# Altium footprint library EPCOS.PcbLib: 178 footprints (part 2 of 12)
Each footprint in its own frame and in the unit in brackets; x right, y up, seen from the top. Pads: shape width x height; smd on the part's side, far side on the other; paste and mask are expansions set on the pad; w line width, h text height; cw(c..) or ccw(c..) is an arc to the next point about the centre after c.
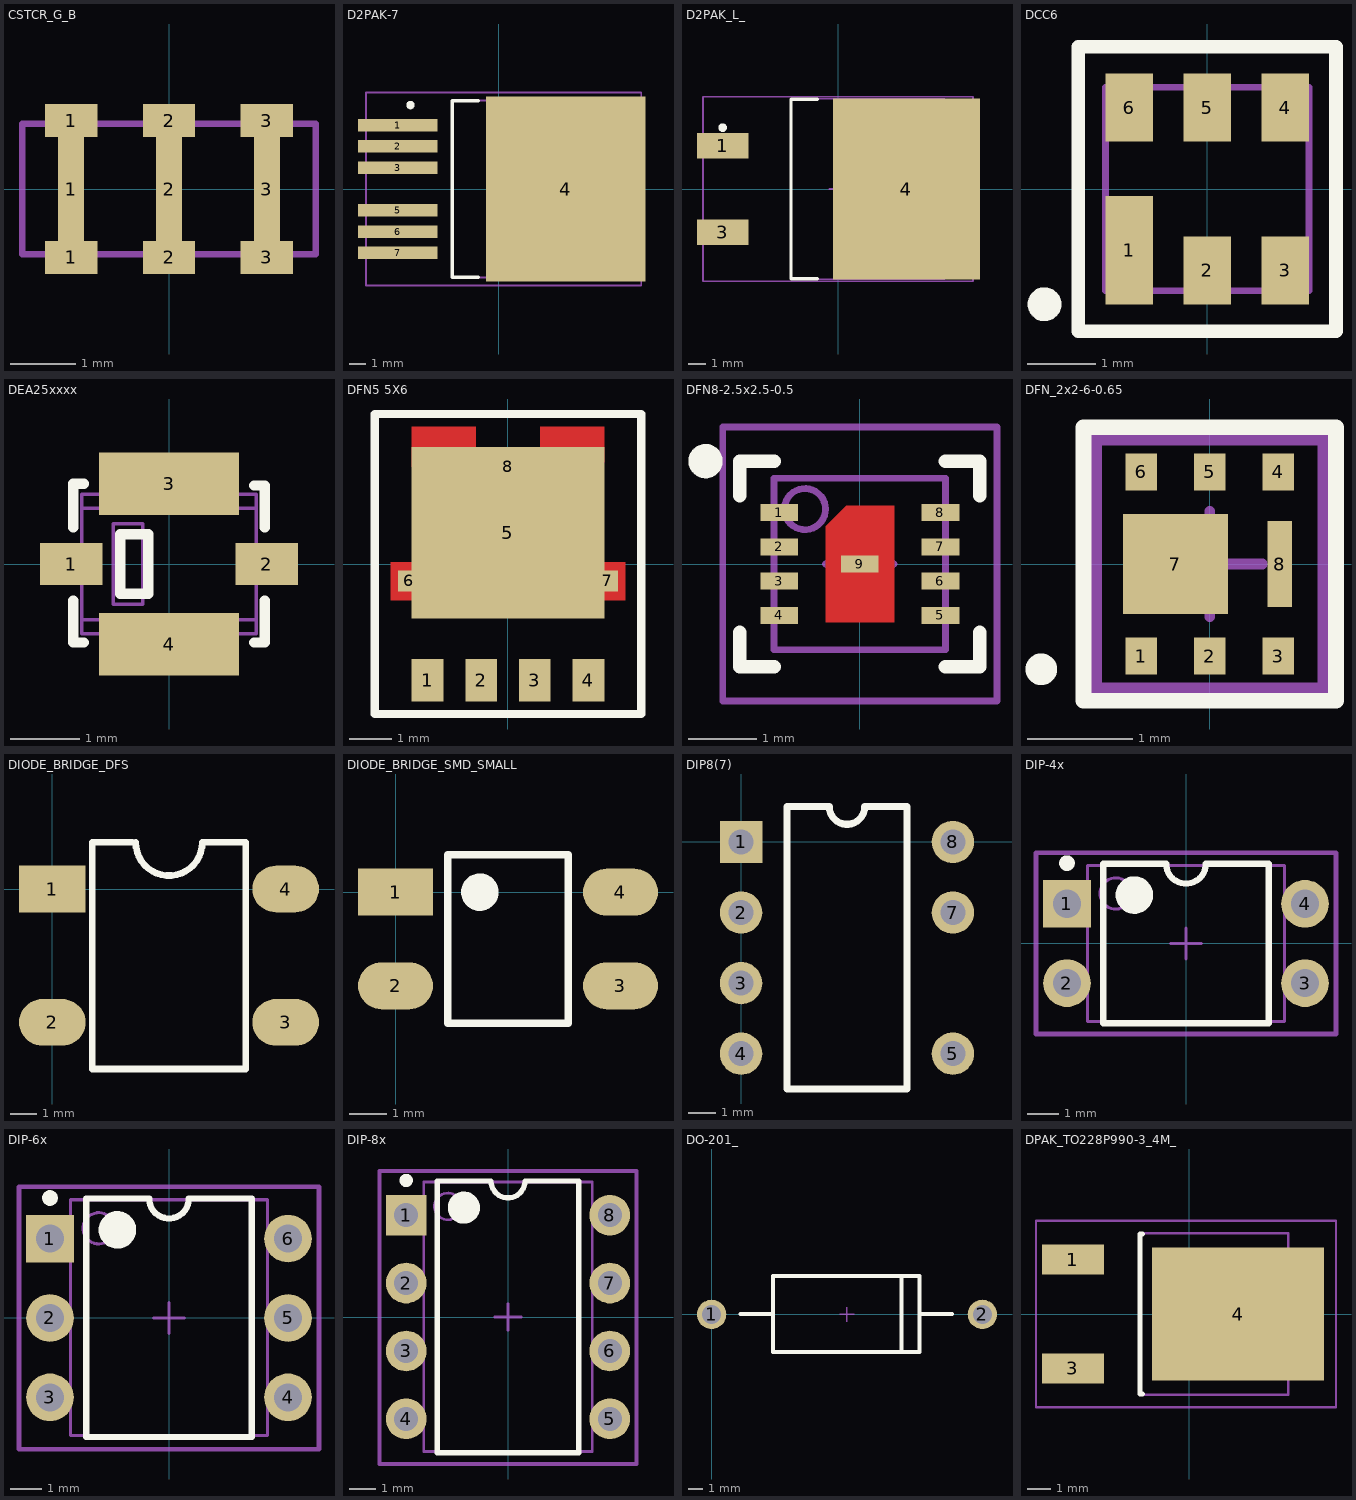
[diagram p1: the footprints below, top view; thin cyan lines are the x and y axes]

## CSTCR_G_B [mm]
height 1.15
pads (9):
  rect 0.8x0.5 smd: 1(-1.5,-1.05) 1(-1.5,1.05) 2(0,-1.05) 2(0,1.05) 3(1.5,-1.05) 3(1.5,1.05)
  rect 0.4x1.6 smd: 1(-1.5,0) 2(0,0) 3(1.5,0)
Mechanical 13:
  lines w0.1: -2.25,-1 -2.25,1 2.25,1 2.25,-1 -2.25,-1
3D body "User Library-CSTCR4M00G53.step": height 1.15, standoff 0, extent -2.25,-1 2.25,1

## D2PAK-7 [mm] "PG-TO263-7"
height 4.75
pads (7):
  rect 4.75x0.75 smd: 1(-6,3.81) 2(-6,2.54) 3(-6,1.27) 5(-6,-1.27) 6(-6,-2.54) 7(-6,-3.81)
  rect 9.5x11 smd: 4(4,0)
Top Overlay:
  circle w0.25: c-5.25,5 r0.125
  lines w0.2: -1.2,-5.25 -2.75,-5.25 -2.75,5.25 -1.2,5.25
Mechanical 13:
  lines w0.1: -2.75,-5.275 -2.75,5.275 6.25,5.275 6.25,-5.275 -2.75,-5.275
Mechanical 15:
  lines w0.1: -0.5,0 0.5,0 ; 0,-0.5 0,0.5 ; -7.9,-5.75 -7.9,5.75 8.5,5.75 8.5,-5.75 -7.9,-5.75
3D body "User Library-TO263-7S.STEP": height 4.88, standoff 0.08, extent -7.6,-5 8.07,5

## D2PAK_L_ [mm]
height 4.75
pads (3):
  rect 3x1.5 smd: 1(-6.75,2.54) 3(-6.75,-2.54)
  rect 8.6x10.6 smd: 4(4,0)
Top Overlay:
  circle w0.25: c-6.75,3.59 r0.125
  lines w0.2: -1.2,-5.25 -2.75,-5.25 -2.75,5.25 -1.2,5.25
Mechanical 13:
  lines w0.1: -2.75,-5.275 6.25,-5.275 6.25,5.275 -2.75,5.275 -2.75,-5.275
Mechanical 15:
  lines w0.1: -0.5,0 0.5,0 ; 0,-0.5 0,0.5 ; -7.9,-5.4 7.9,-5.4 7.9,5.4 -7.9,5.4 -7.9,-5.4
3D body "User Library-DPAK.step": height 4.98, standoff -0.03, extent -7.666,-5.08 7.598,5.08

## DCC6 [mm] "SAW Filter DCC6 Footprint"
height 1
pads (6):
  rect 0.7x1.6 smd paste+0 mask+0: 1(-1.15,-0.9)
  rect 0.7x1 smd paste+0 mask+0: 2(0,-1.2) 3(1.15,-1.2) 4(1.15,1.2) 5(0,1.2) 6(-1.15,1.2)
Top Overlay:
  circle w0.25: c-2.4,-1.7 r0.125
  lines w0.2: -1.9,-2.1 -1.9,-0.8 -1.9,2.1 1.2,2.1 1.9,2.1 1.9,-0.8 1.9,-2.1 1.2,-2.1 -1.9,-2.1
Mechanical 15:
  lines w0.1: -1.5,-1.5 1.5,-1.5 1.5,1.5 -1.5,1.5 -1.5,1 -1.5,-1.5
3D body "User Library-DCC6C.STEP": height 1.14, standoff -0.09, extent -1.5,-1.5 1.5,1.5

## DEA25xxxx [mm] "Multilayer Band Pass Filter"
height 1.5
pads (4):
  rect 0.9x0.6 smd: 1(-1.4,0) 2(1.4,0)
  rect 2x0.9 smd: 3(0,1.15) 4(0,-1.15)
Top Overlay:
  lines w0.15: -1.375,-0.525 -1.375,-1.125 -1.225,-1.125 ; -1.375,0.525 -1.375,1.15 -1.225,1.15 ; 1.225,-1.125 1.375,-1.125 1.375,-0.525 ; 1.225,1.125 1.375,1.125 1.375,0.525 ; -0.7,-0.425 -0.7,0.425 -0.3,0.425 -0.3,-0.425 -0.7,-0.425
Mechanical 13:
  lines w0.05: -1.25,-0.8 1.25,-0.8 ; -1.25,0.8 1.25,0.8 ; -1.25,-1 -1.25,1 1.25,1 1.25,-1 -1.25,-1 ; -1.25,-0.25 -1.25,0.25 -1,0.25 -1,-0.25 -1.25,-0.25 ; -0.8,-0.575 -0.8,0.575 -0.375,0.575 -0.375,-0.575 -0.8,-0.575 ; 1,-0.25 1.25,-0.25 1.25,0.225 1,0.225 1,-0.25
3D body: height 1.5, standoff 0, extent -0.799,-0.574 -0.376,0.574
3D body: height 1.49, standoff 0, extent -1.275,-1 1.275,1
3D body: height 1.5, standoff 0, extent -1.3,-1.025 1.3,-0.801
3D body: height 1.5, standoff 0, extent -1.3,-0.249 -1.001,0.249
3D body: height 1.5, standoff 0, extent -1.3,0.801 1.3,1.025
3D body: height 1.5, standoff 0, extent 1.001,-0.249 1.3,0.224

## DFN5 5X6 [mm]
height 1.1
pads (8):
  rect 0.75x1 smd: 1(-1.905,-2.75) 2(-0.635,-2.75) 3(0.635,-2.75) 4(1.905,-2.75)
  rect 4.56x4.055 smd: 5(0,0.743)
  rect 0.5x0.5 smd: 6(-2.35,-0.4) 7(2.35,-0.4) 8(0,2.3)
Top Layer:
  rectangle: -2.28,2.296 -0.76,3.25
  region: 2.28,3.25 0.76,3.25 0.76,2.396 2.28,2.396
  rectangle: -2.78,-0.86 -2,0.05
  region: 2.78,0.05 1.7,0.05 1.7,-0.86 2.78,-0.86
Top Overlay:
  lines w0.2: -3.15,-3.55 3.15,-3.55 3.15,3.55 -3.15,3.55 -3.15,-0.55 -3.15,-3.55
Top Solder:
  rectangle: -2.88,-0.96 -2.28,0.15
  region: 2.88,0.15 2.28,0.15 2.28,-0.96 2.88,-0.96
  rectangle: -2.38,2.85 -0.66,3.35
  region: 2.38,3.35 0.66,3.35 0.66,2.85 2.38,2.85
3D body "User Library-DFN8-5X6 DUAL.step": height 1.1, standoff 0, extent -2.575,-3.075 2.575,3.075

## DFN8-2.5x2.5-0.5 [mm]
height 0.9
pads (9):
  rect 0.55x0.25 smd: 1(-1.175,0.75) 2(-1.175,0.25) 3(-1.175,-0.25) 4(-1.175,-0.75) 5(1.175,-0.75) 6(1.175,-0.25) 7(1.175,0.25) 8(1.175,0.75) 9(0,0)
Top Layer:
  region: 0.5,0.85 0.5,-0.85 -0.5,-0.85 -0.5,0.55 -0.2,0.85
Top Overlay:
  circle w0.25: c-2.25,1.5 r0.125
  lines w0.2: -1.75,-1 -1.75,-1.5 -1.25,-1.5 ; -1.75,1 -1.75,1.5 -1.25,1.5 ; 1.25,-1.5 1.75,-1.5 1.75,-1 ; 1.25,1.5 1.75,1.5 1.75,1
Mechanical 13:
  circle w0.1: c-0.8,0.8 r0.3
  lines w0.1: -1.25,-1.25 -1.25,1.25 1.25,1.25 1.25,-1.25 -1.25,-1.25
Mechanical 15:
  lines w0.1: -0.5,0 0.5,0 ; 0,-0.5 0,0.5 ; -2,-2 -2,2 2,2 2,-2 -2,-2
3D body "User Library-sht3x-1.step": height 0.9, standoff 0, extent -1.25,-1.225 1.25,1.275

## DFN_2x2-6-0.65 [mm]
height 0.6
pads (8):
  rect 0.3x0.35 smd mask+0.05: 1(-0.65,-0.875) 2(0,-0.875) 3(0.65,-0.875) 4(0.65,0.875) 5(0,0.875) 6(-0.65,0.875)
  rect 1x0.95 smd mask+0.05: 7(-0.325,0)
  rect 0.23x0.82 smd mask+0.05: 8(0.665,0)
Top Overlay:
  circle w0.2: c-1.6,-1 r0.05
  lines w0.15: -1.2,-1.3 1.2,-1.3 1.2,1.3 -1.2,1.3 -1.2,-1.3
Mechanical 15:
  lines w0.1: -0.5,0 0.5,0 ; 0,-0.5 0,0.5
  lines w0.15: -1.1,-1.2 1.1,-1.2 1.1,1.2 -1.1,1.2 -1.1,-1.2
3D body "User Library-dfnw6.step": height 0.85, standoff 0, extent -1,-1.1 1,1.1

## DIODE_BRIDGE_DFS [mil]
height 157.48
pads (4):
  rect 100x70 smd: 1(0,0)
  oval 100x70 smd: 2(0,-200) 3(350,-200) 4(350,0)
Top Overlay:
  lines w10: 120,70 60,70 60,-270 290,-270 290,70 225,70 cw(c175,70) 125,70
3D body: height 0, standoff 0, extent 59.98,-270.02 290.02,70.02
3D body "User Library-Bridge rectifier DFS package-1.step": height 118.75, standoff 0, extent -21.14,-271.65 371.37,74.81

## DIODE_BRIDGE_SMD_SMALL [mm]
height 2.9
pads (4):
  rect 2x1.25 smd: 1(0,0)
  oval 2x1.25 smd: 2(0,-2.5) 3(6,-2.5) 4(6,0)
Top Overlay:
  circle w0.5: c2.25,0 r0.25
  lines w0.2: 1.4,-3.5 1.4,1 4.6,1 4.6,-3.5 1.4,-3.5
3D body "User Library-SO4.step": height 2.18, standoff 0, extent -0.04,-3.3 6.04,0.8

## DIP8(7) [mil]
pads (7):
  rect 60x60 hole 35.43: 1(0,0)
  round 60 hole 35.43: 2(0,-100) 3(0,-200) 4(0,-300) 5(300,-300) 7(300,-100) 8(300,0)
Top Overlay:
  lines w10: 65,-350 65,50 125,50 ccw(c150,50) 175,50 235,50 235,-350 65,-350

## DIP-4x [mil] "DIP, 4-Pin, Row Spacing 7.62 mm, Pitch 2.54 mm"
height 179.92
pads (4):
  rect 60x60 hole 35.43: 1(-150,50)
  round 60 hole 35.43: 2(-150,-50) 3(150,-50) 4(150,50)
Top Overlay:
  circle w23.62: c-64.96,61.02 r11.81
  circle w9.84: c-150,101.18 r4.92
  lines w7.87: -104.33,-100.39 104.33,-100.39 104.33,100.39 25,100.39 cw(c0,100.39) -25,100.39 -104.33,100.39 -104.33,-100.39
Mechanical 13:
  circle w3.94: c-88.58,62.99 r19.68
  lines w3.94: -124.02,-98.43 124.02,-98.43 124.02,98.43 -124.02,98.43 -124.02,-98.43
Mechanical 15:
  lines w3.94: -19.68,0 19.68,0 ; 0,-19.68 0,19.68
  lines w5.91: -188.98,-114.17 188.98,-114.17 188.98,114.17 -188.98,114.17 -188.98,-114.17
3D body "User Library-DIP4-7_62-2_54.step": height 169.29, standoff -106.3, extent -155.11,-90.35 155.12,90.37

## DIP-6x [mil] "DIP, 6-Pin, Row Spacing 7.62 mm, Pitch 2.54 mm"
height 179.92
pads (6):
  rect 60x60 hole 35.43: 1(-150,100)
  round 60 hole 35.43: 2(-150,0) 3(-150,-100) 4(150,-100) 5(150,0) 6(150,100)
Top Overlay:
  circle w9.84: c-150,151.18 r4.92
  circle w23.62: c-64.96,111.02 r11.81
  lines w7.87: -104.33,-150 -104.33,150.39 -25,150.39 ccw(c0,150.39) 25,150.39 104.33,150.39 104.33,-150 -104.33,-150
Mechanical 13:
  circle w3.94: c-88.58,112.99 r19.68
  lines w3.94: -124.02,-148 -124.02,149 124.02,149 124.02,-148 -124.02,-148
Mechanical 15:
  lines w3.94: -19.68,0 19.68,0 ; 0,-19.68 0,19.68
  lines w5.91: -188.98,-165.35 188.98,-165.35 188.98,165.35 -188.98,165.35 -188.98,-165.35
3D body "User Library-DIP6-White.STEP": height 177.17, standoff -110.24, extent -154.92,-138.58 154.92,141.73

## DIP-8x [mil] "DIP, 8-Pin, Row Spacing 7.62 mm, Pitch 2.54 mm"
height 179.92
pads (8):
  rect 60x60 hole 35.43: 1(-150,150)
  round 60 hole 35.43: 2(-150,50) 3(-150,-50) 4(-150,-150) 5(150,-150) 6(150,-50) 7(150,50) 8(150,150)
Top Overlay:
  circle w23.62: c-64.96,161.02 r11.81
  circle w9.84: c-150,201.18 r4.92
  lines w7.87: -104.33,-200 104.33,-200 104.33,200.39 25,200.39 cw(c0,200.39) -25,200.39 -104.33,200.39 -104.33,-200
Mechanical 13:
  circle w3.94: c-88.58,162.99 r19.68
  lines w3.94: -124.02,-198 124.02,-198 124.02,199 -124.02,199 -124.02,-198
Mechanical 15:
  lines w3.94: -19.68,0 19.68,0 ; 0,-19.68 0,19.68
  lines w5.91: -188.98,-216.54 -188.98,215.35 188.98,215.35 188.98,-216.54 -188.98,-216.54
3D body "User Library-DIP-8P-M01.step": height 171.65, standoff -118.11, extent -154.33,-185.04 155.51,185.04

## DO-201_ [mm]
height 5.3
pads (2):
  round 2 hole 1.3: 1(0,0) 2(18.5,0)
Top Overlay:
  lines w0.254: 1.95,0.025 4.2,0.025 ; 12.975,-2.575 12.975,2.625 ; 14.2,0.025 16.45,0.025 ; 4.2,-2.575 4.2,2.625 14.2,2.625 14.2,-2.575 4.2,-2.575
Mechanical 15:
  lines w0.1: 8.75,0 9.75,0 ; 9.25,-0.5 9.25,0.5
3D body "User Library-DO-201ADDO-27.step": height 5.82, standoff -3.8, extent -0.795,-2.82 19.345,2.82

## DPAK_TO228P990-3_4M_ [mm] "D-PAK, 4-Leads, Body 6.1x6.5mm, Pitch 2.28mm, Lead Span 9.9mm, IPC Low Density"
height 2.489
pads (3):
  rect 2.592x1.27 smd: 1(-4.862,2.28) 3(-4.862,-2.28)
  rect 7.2x5.55 smd paste-0.25: 4(2.05,0)
Top Overlay:
  lines w0.2: -1.95,-3.35 -2.05,-3.35 -2.05,3.35 -1.95,3.35
Mechanical 13:
  lines w0.1: -2.05,-3.375 4.15,-3.375 4.15,3.375 -2.05,3.375 -2.05,-3.375
Mechanical 15:
  lines w0.1: -0.5,0 0.5,0 ; 0,-0.5 0,0.5 ; -6.404,-3.9 6.15,-3.9 6.15,3.9 -6.404,3.9 -6.404,-3.9
3D body "User Library-DPAK_TO-252AA.step": height 2.47, standoff 0.07, extent -5.048,-3.367 5.052,3.367